# Altium footprint library 常用原件库.PcbLib: 163 footprints (part 1 of 11)
Each footprint in its own frame and in the unit in brackets; x right, y up, seen from the top. Pads: shape width x height; smd on the part's side, far side on the other; paste and mask are expansions set on the pad; w line width, h text height; cw(c..) or ccw(c..) is an arc to the next point about the centre after c.
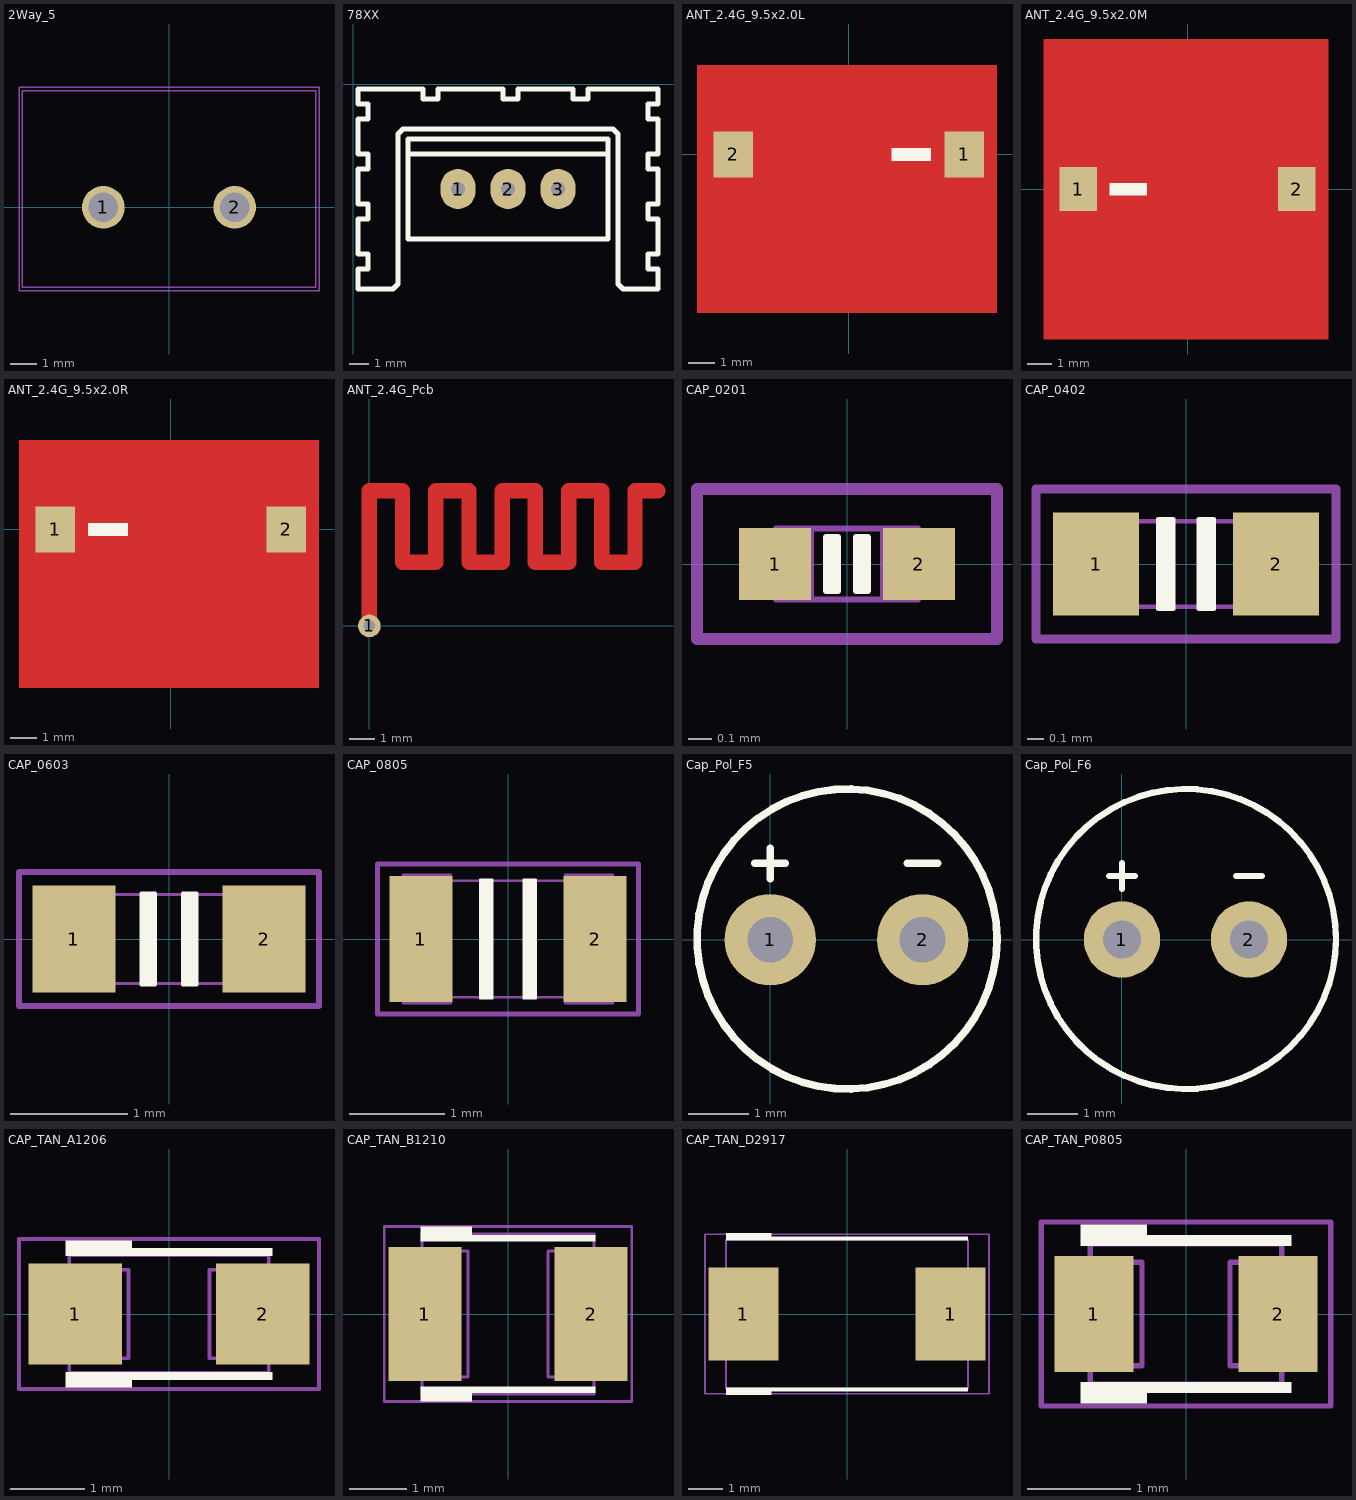
[diagram p0: the footprints below, top view; thin cyan lines are the x and y axes]

## 2Way_5 [mil]
height 501.97
pads (2):
  round 64 hole 44: 1(-98.43,0) 2(98.43,0)
Mechanical 13:
  lines w2: -220,-120 -220,175 220,175 220,-120 -220,-120
Mechanical 14:
  lines w2: -225,-125 225,-125 225,180 -225,180 -225,-125
3D body: height 590.55, standoff -137.8, extent -224.65,-185 197.8,189.02

## 78XX [mil] "78 系列的稳压片"
pads (3):
  oval 70x80 hole 28: 1(210,-210) 2(310,-210) 3(410,-210)
Top Overlay:
  lines w10: 110,-140 510,-140 ; 10,-410 80,-410 90,-400 90,-100 100,-90 520,-90 530,-100 530,-400 540,-410 560,-410 610,-410 610,-370 590,-370 590,-340 610,-340 610,-270 590,-270 590,-240 610,-240 610,-170 590,-170 590,-140 610,-140 610,-70 590,-70 590,-40 610,-40 610,-10 470,-10 470,-30 440,-30 440,-10 330,-10 330,-30 300,-30 300,-10 170,-10 170,-30 140,-30 140,-10 10,-10 10,-40 30,-40 30,-70 10,-70 10,-140 30,-140 30,-170 10,-170 10,-240 30,-240 30,-270 10,-270 10,-340 30,-340 30,-370 10,-370 10,-410 ; 110,-310 510,-310 510,-110 110,-110 110,-310

## ANT_2.4G_9.5x2.0L [mil]
height 47.24
pads (2):
  rect 60x70 smd: 1(175,0) 2(-175,0)
Top Layer:
  pour cut-out: -230,-240 225,-240 225,135 -230,135
Top Overlay:
  region: 125,10 65,10 65,-10 125,-10
Mechanical 13:
  lines w2: -167.32,-39.37 -167.32,39.37 ; 167.32,-39.37 167.32,39.37 ; -187.01,-39.37 187.01,-39.37 187.01,39.37 -187.01,39.37 -187.01,-39.37
3D body: height 40.16, standoff -0.79, extent -187.8,-40.31 187.8,40

## ANT_2.4G_9.5x2.0M [mil]
height 47.24
pads (2):
  rect 60x70 smd: 1(-175,0) 2(175,0)
Top Layer:
  pour cut-out: -230,-240 225,-240 225,240 -230,240
Top Overlay:
  rectangle: -125,-10 -65,10
Mechanical 13:
  lines w2: -167.32,-39.37 -167.32,39.37 ; 167.32,-39.37 167.32,39.37 ; -187.01,-39.37 187.01,-39.37 187.01,39.37 -187.01,39.37 -187.01,-39.37
3D body: height 40.16, standoff -0.79, extent -187.8,-40 187.8,40.31

## ANT_2.4G_9.5x2.0R [mil]
height 47.24
pads (2):
  rect 60x70 smd: 1(-175,0) 2(175,0)
Top Layer:
  pour cut-out: -230,-240 225,-240 225,135 -230,135
Top Overlay:
  rectangle: -125,-10 -65,10
Mechanical 13:
  lines w2: -167.32,-39.37 -167.32,39.37 ; 167.32,-39.37 167.32,39.37 ; -187.01,-39.37 187.01,-39.37 187.01,39.37 -187.01,39.37 -187.01,-39.37
3D body: height 40.16, standoff -0.79, extent -187.8,-40 187.8,40.31

## ANT_2.4G_Pcb [mil]
pads (1):
  round 35 hole 18: 1(0,0)
Top Layer:
  lines w23.62: 0,3.51 0,208.24 51.18,208.24 51.18,98 102.36,98 102.36,208.24 153.54,208.24 153.54,98 204.72,98 204.72,208.24 255.91,208.24 255.91,98 307.09,98 307.09,208.24 358.27,208.24 358.27,98 409.45,98 409.45,208.24 444.88,208.24

## CAP_0201 [mil]
height 15.75
pads (2):
  rect 12x12 smd: 1(-12,0) 2(12,0)
Top Overlay:
  region: 3.5,4.5 3.5,-4.5 1.5,-4.5 1.5,4.5
  region: -3.5,-4.5 -3.5,4.5 -1.5,4.5 -1.5,-4.5
  lines w1: -3.5,-4.5 -3.5,4.5 -1.5,4.5 -1.5,-4.5 -3.5,-4.5 ; 1.5,-4.5 3.5,-4.5 3.5,4.5 1.5,4.5 1.5,-4.5
Mechanical 13:
  lines w1: -6,-5.9 -6,5.91 ; 6,-5.92 6,5.89 ; -11.8,-5.9 11.82,-5.9 11.82,5.91 -11.8,5.91 -11.8,-5.9
Mechanical 14:
  lines w2: -25,-12.5 25,-12.5 25,12.5 -25,12.5 -25,-12.5
3D body: height 12.99, standoff 0, extent -11.8,-5.9 11.82,5.91

## CAP_0402 [mil]
height 21.65
pads (2):
  rect 20x24 smd: 1(-21,0) 2(21,0)
Top Overlay:
  region: 6.5,-10.5 3,-10.5 3,10.5 6.5,10.5
  region: -6.5,10.5 -3,10.5 -3,-10.5 -6.5,-10.5
  lines w1: -6.5,-10.5 -6.5,10.5 -3,10.5 -3,-10.5 -6.5,-10.5 ; 3,-10.5 6.5,-10.5 6.5,10.5 3,10.5 3,-10.5
Mechanical 13:
  lines w1: -12.8,-10 12.8,-10 ; -12.8,10 12.8,10 ; -20.67,-10.83 -20.67,10.83 -12.8,10.83 -12.8,-10.83 -20.67,-10.83 ; 12.8,-10.83 20.67,-10.83 20.67,10.83 12.8,10.83 12.8,-10.83
Mechanical 14:
  lines w2: -35,-17.5 -35,17.5 35,17.5 35,-17.5 -35,-17.5
3D body: height 22.05, standoff 0, extent -19.68,-9.84 19.69,9.85

## CAP_0603 [mil]
height 31.5
pads (2):
  rect 28x36 smd: 1(-32,0) 2(32,0)
Top Overlay:
  region: 4.5,-15.5 9.5,-15.5 9.5,15.5 4.5,15.5
  region: -4.5,15.5 -9.5,15.5 -9.5,-15.5 -4.5,-15.5
  lines w1: -9.5,-15.5 -4.5,-15.5 -4.5,15.5 -9.5,15.5 -9.5,-15.5 ; 4.5,-15.5 4.5,15.5 9.5,15.5 9.5,-15.5 4.5,-15.5
Mechanical 13:
  lines w1: -19,-15 19,-15 ; -18.99,15 19.01,15 ; -33,-17 -19,-17 -19,17 -33,17 -33,-17 ; 19.01,-17 19.01,17 33.01,17 33.01,-17 19.01,-17
Mechanical 14:
  lines w2: -50.5,-22.5 50.5,-22.5 50.5,22.5 -50.5,22.5 -50.5,-22.5
3D body: height 36.22, standoff 0, extent -31.49,-15.74 31.5,15.75

## CAP_0805 [mil]
height 47.24
pads (2):
  rect 26x52 smd: 1(-36,0) 2(36,0)
Top Overlay:
  region: -11.5,24.5 -6.5,24.5 -6.5,-24.5 -11.5,-24.5
  region: 11.5,-24.5 6.5,-24.5 6.5,24.5 11.5,24.5
  lines w1: -11.5,-24.5 -6.5,-24.5 -6.5,24.5 -11.5,24.5 -11.5,-24.5 ; 6.5,-24.5 6.5,24.5 11.5,24.5 11.5,-24.5 6.5,-24.5
Mechanical 13:
  lines w1: -23.62,-24 23.62,-24 ; -23.62,24 23.62,24 ; -43.31,-26.57 -43.31,26.57 -23.62,26.57 -23.62,-26.57 -43.31,-26.57 ; 23.62,-26.57 43.31,-26.57 43.31,26.57 23.62,26.57 23.62,-26.57
Mechanical 14:
  lines w2: -54,-31 54,-31 54,31 -54,31 -54,-31
3D body: height 50, standoff 0, extent -39.36,-23.62 39.38,23.63

## Cap_Pol_F5 [mil] "Cap F5"
pads (2):
  round 60 hole 30: 1(0,0) 2(100,0)
Top Overlay:
  circle w5: c50.4,0.4 r98.43
  lines w5: -10,50 10,50 ; 0,40 0,60 ; 90,50 110,50

## Cap_Pol_F6 [mil] "Cap F5"
pads (2):
  round 60 hole 30: 1(0,0) 2(100,0)
Top Overlay:
  circle w5: c50.4,0.4 r118.11
  lines w5: -10,50 10,50 ; 0,40 0,60 ; 90,50 110,50

## CAP_TAN_A1206 [mil]
height 70.87
pads (2):
  rect 50x54 smd: 1(-50,0) 2(50,0)
Top Overlay:
  region: 55,-35 -20,-35 -20,-39 -55,-39 -55,-31 55,-31
  region: 55,31 -55,31 -55,39 -20,39 -20,35 55,35
Mechanical 13:
  lines w2: -63,-23.63 -63,23.62 -21.66,23.62 -21.66,-23.63 -63,-23.63 ; -53.16,-31.5 53.15,-31.5 53.15,31.5 -53.16,31.5 -53.16,-31.5 ; 21.65,-23.62 21.65,23.62 62.99,23.62 62.99,-23.62 21.65,-23.62
Mechanical 14:
  lines w2: -80,-40 80,-40 80,40 -80,40 -80,-40
3D body: height 70.87, standoff 0, extent -62.99,-31.49 63,31.5

## CAP_TAN_B1210 [mil]
height 82.68
pads (2):
  rect 50x92 smd: 1(-57,0) 2(57,0)
Top Overlay:
  region: 60,50 -60,50 -60,60 -25,60 -25,54 60,54
  region: 60,-54 -25,-54 -25,-60 -60,-60 -60,-50 60,-50
Mechanical 13:
  lines w2: -68.89,-43.3 -27.55,-43.3 -27.55,43.31 -68.89,43.31 -68.89,-43.3 ; -59.06,-55.11 -59.06,55.12 59.05,55.12 59.05,-55.11 -59.06,-55.11 ; 27.56,-43.31 27.56,43.31 68.9,43.31 68.9,-43.31 27.56,-43.31
Mechanical 14:
  lines w2: -85,-60 85,-60 85,60 -85,60 -85,-60
3D body: height 82.68, standoff 0, extent -68.89,-55.11 68.91,55.13

## CAP_TAN_D2917 [mil]
height 122.05
pads (2):
  rect 80x106 smd: 1(-118,0) 1(118,0)
Top Overlay:
  region: 137.8,-88 -86.61,-88 -86.61,-92 -137.8,-92 -137.8,-84 137.8,-84
  region: 137.8,84 -137.8,84 -137.8,92 -86.61,92 -86.61,88 137.8,88
Mechanical 13:
  lines w2: -143.7,-47.24 -143.7,47.24 -86.61,47.24 -86.61,-47.24 -143.7,-47.24 ; -137.8,-84.65 137.8,-84.65 137.8,84.65 -137.8,84.65 -137.8,-84.65 ; 86.61,-47.24 143.7,-47.24 143.7,47.24 86.61,47.24 86.61,-47.24
Mechanical 14:
  lines w2: -162,-91 162,-91 162,91 -162,91 -162,-91
3D body: height 122.05, standoff 0, extent -149.6,-77.75 149.61,77.76

## CAP_TAN_P0805 [mil]
height 59.06
pads (2):
  rect 30x44 smd: 1(-35,0) 2(35,0)
Top Overlay:
  region: 40,26 -40,26 -40,34 -15,34 -15,30 40,30
  region: 40,-30 -15,-30 -15,-34 -40,-34 -40,-26 40,-26
Mechanical 13:
  lines w2: -40.35,-19.68 -16.73,-19.68 -16.73,19.68 -40.35,19.68 -40.35,-19.68 ; -36.42,-26.57 -36.42,26.57 36.42,26.57 36.42,-26.57 -36.42,-26.57 ; 16.73,-19.68 40.35,-19.68 40.35,19.68 16.73,19.68 16.73,-19.68
Mechanical 14:
  lines w2: -55,-35 55,-35 55,35 -55,35 -55,-35
3D body: height 59.06, standoff 0, extent -40.35,-26.57 40.36,26.58